# Altium integrated library 860010374011_Altium_WCAP-ATG8_rev19a.IntLib: 195 symbols (part 1 of 2) (continued)
## 860010372003
designator C?, comment 33uF, 16V
WCAP-ATG8 THT Aluminum Electrolytic Capacitors, D5mm x L11mm, 33uF, +/-20%, 16VDC; Part Number: 860010372003; Dissipation Factor: 16%; Endurance: 2000h; Leakage Current: 5.28uA; Ripple Current max.: 84mA; Technical Reference: ATBC110330M016DSPA3B000; ComponentLink1Description: Manufacturer; ComponentLink1URL: http://www.we-online.de; ComponentLink2Description: Datasheet; ComponentLink2URL: https://katalog.we-online.com/pbs/datasheet/860010372003.pdf; Length: 11mm; Mounting Technology: THT; Operating Temperature: -40 to +85degC; Packaging: Ammo Pack; Published Date: August 2019; Capacitance: 33uF; Diameter: 5mm; Publisher: Wurth Elektronik; Capacitance Tolerance: +/-20%; Rated Voltage: 16VDC
footprint WCAP-ATG8_5x11
pins: 1 N, 2 P

## 860010372004
designator C?, comment 47uF, 16V
WCAP-ATG8 THT Aluminum Electrolytic Capacitors, D5mm x L11mm, 47uF, +/-20%, 16VDC; Part Number: 860010372004; Dissipation Factor: 16%; Endurance: 2000h; Leakage Current: 7.52uA; Ripple Current max.: 132mA; Technical Reference: ATBC110470M016DSPA3B000; ComponentLink1Description: Manufacturer; ComponentLink1URL: http://www.we-online.de; ComponentLink2Description: Datasheet; ComponentLink2URL: https://katalog.we-online.com/pbs/datasheet/860010372004.pdf; Length: 11mm; Mounting Technology: THT; Operating Temperature: -40 to +85degC; Packaging: Ammo Pack; Published Date: August 2019; Capacitance: 47uF; Diameter: 5mm; Publisher: Wurth Elektronik; Capacitance Tolerance: +/-20%; Rated Voltage: 16VDC
footprint WCAP-ATG8_5x11
pins: 1 N, 2 P

## 860010372005
designator C?, comment 68uF, 16V
WCAP-ATG8 THT Aluminum Electrolytic Capacitors, D5mm x L11mm, 68uF, +/-20%, 16VDC; Part Number: 860010372005; Dissipation Factor: 16%; Endurance: 2000h; Leakage Current: 10.88uA; Ripple Current max.: 149mA; Technical Reference: ATBC110680M016DSPA3B000; ComponentLink1Description: Manufacturer; ComponentLink1URL: http://www.we-online.de; ComponentLink2Description: Datasheet; ComponentLink2URL: https://katalog.we-online.com/pbs/datasheet/860010372005.pdf; Length: 11mm; Mounting Technology: THT; Operating Temperature: -40 to +85degC; Packaging: Ammo Pack; Published Date: August 2019; Capacitance: 68uF; Diameter: 5mm; Publisher: Wurth Elektronik; Capacitance Tolerance: +/-20%; Rated Voltage: 16VDC
footprint WCAP-ATG8_5x11
pins: 1 N, 2 P

## 860010372006
designator C?, comment 100uF, 16V
WCAP-ATG8 THT Aluminum Electrolytic Capacitors, D5mm x L11mm, 100uF, +/-20%, 16VDC; Part Number: 860010372006; Dissipation Factor: 16%; Endurance: 2000h; Leakage Current: 16uA; Ripple Current max.: 176mA; Technical Reference: ATBC110101M016DSPA3B000; ComponentLink1Description: Manufacturer; ComponentLink1URL: http://www.we-online.de; ComponentLink2Description: Datasheet; ComponentLink2URL: https://katalog.we-online.com/pbs/datasheet/860010372006.pdf; Length: 11mm; Mounting Technology: THT; Operating Temperature: -40 to +85degC; Packaging: Ammo Pack; Published Date: August 2019; Capacitance: 100uF; Diameter: 5mm; Publisher: Wurth Elektronik; Capacitance Tolerance: +/-20%; Rated Voltage: 16VDC
footprint WCAP-ATG8_5x11
pins: 1 N, 2 P

## 860010373007
designator C?, comment 120uF, 16V
WCAP-ATG8 THT Aluminum Electrolytic Capacitors, D6.3mm x L11mm, 120uF, +/-20%, 16VDC; Part Number: 860010373007; Dissipation Factor: 16%; Endurance: 2000h; Leakage Current: 19.2uA; Ripple Current max.: 231mA; Technical Reference: ATBD110121M016DSPA4B000; ComponentLink1Description: Manufacturer; ComponentLink1URL: http://www.we-online.de; ComponentLink2Description: Datasheet; ComponentLink2URL: https://katalog.we-online.com/pbs/datasheet/860010373007.pdf; Length: 11mm; Mounting Technology: THT; Operating Temperature: -40 to +85degC; Packaging: Ammo Pack; Published Date: August 2019; Capacitance: 120uF; Diameter: 6.3mm; Publisher: Wurth Elektronik; Capacitance Tolerance: +/-20%; Rated Voltage: 16VDC
footprint WCAP-ATG8_6.3x11
pins: 1 N, 2 P

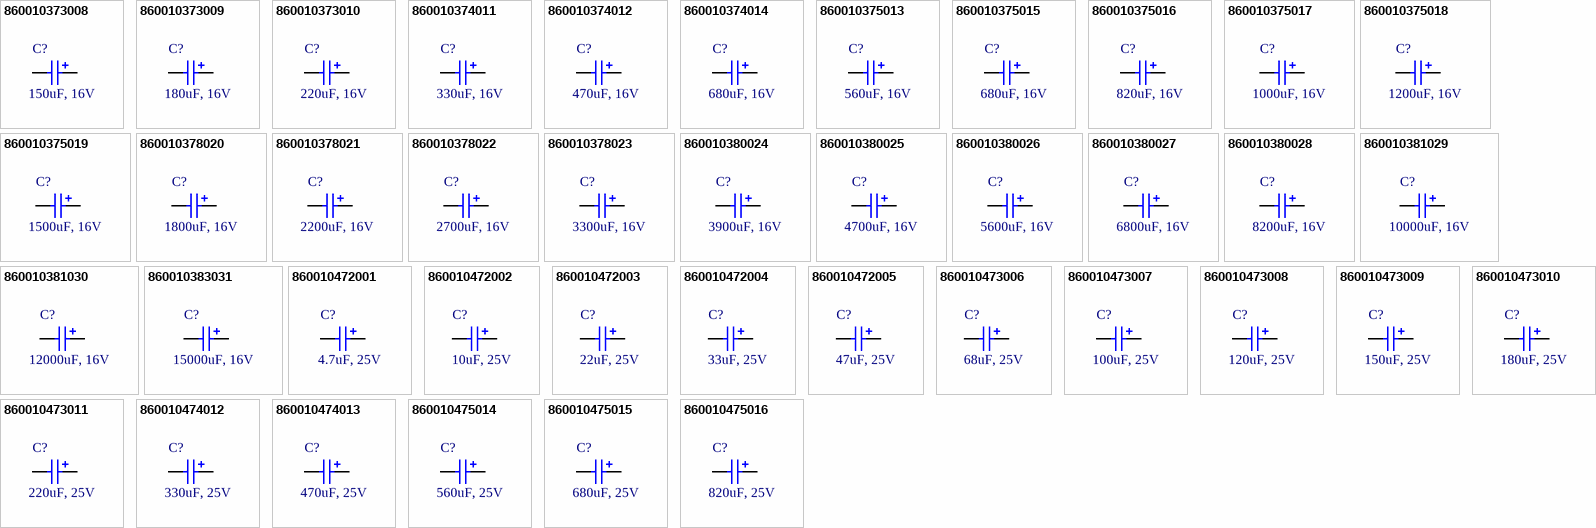
[diagram p1: symbols 860010373008 to 860010475016]

## 860010373008
designator C?, comment 150uF, 16V
WCAP-ATG8 THT Aluminum Electrolytic Capacitors, D6.3mm x L11mm, 150uF, +/-20%, 16VDC; Part Number: 860010373008; Dissipation Factor: 16%; Endurance: 2000h; Leakage Current: 24uA; Ripple Current max.: 253mA; Technical Reference: ATBD110151M016DSPA4B000; ComponentLink1Description: Manufacturer; ComponentLink1URL: http://www.we-online.de; ComponentLink2Description: Datasheet; ComponentLink2URL: https://katalog.we-online.com/pbs/datasheet/860010373008.pdf; Length: 11mm; Mounting Technology: THT; Operating Temperature: -40 to +85degC; Packaging: Ammo Pack; Published Date: August 2019; Capacitance: 150uF; Diameter: 6.3mm; Publisher: Wurth Elektronik; Capacitance Tolerance: +/-20%; Rated Voltage: 16VDC
footprint WCAP-ATG8_6.3x11
pins: 1 N, 2 P

## 860010373009
designator C?, comment 180uF, 16V
WCAP-ATG8 THT Aluminum Electrolytic Capacitors, D6.3mm x L11mm, 180uF, +/-20%, 16VDC; Part Number: 860010373009; Dissipation Factor: 16%; Endurance: 2000h; Leakage Current: 28.8uA; Ripple Current max.: 275mA; Technical Reference: ATBD110181M016DSPA4B000; ComponentLink1Description: Manufacturer; ComponentLink1URL: http://www.we-online.de; ComponentLink2Description: Datasheet; ComponentLink2URL: https://katalog.we-online.com/pbs/datasheet/860010373009.pdf; Length: 11mm; Mounting Technology: THT; Operating Temperature: -40 to +85degC; Packaging: Ammo Pack; Published Date: August 2019; Capacitance: 180uF; Diameter: 6.3mm; Publisher: Wurth Elektronik; Capacitance Tolerance: +/-20%; Rated Voltage: 16VDC
footprint WCAP-ATG8_6.3x11
pins: 1 N, 2 P

## 860010373010
designator C?, comment 220uF, 16V
WCAP-ATG8 THT Aluminum Electrolytic Capacitors, D6.3mm x L11mm, 220uF, +/-20%, 16VDC; Part Number: 860010373010; Dissipation Factor: 16%; Endurance: 2000h; Leakage Current: 35.2uA; Ripple Current max.: 308mA; Technical Reference: ATBD110221M016DSPA4B000; ComponentLink1Description: Manufacturer; ComponentLink1URL: http://www.we-online.de; ComponentLink2Description: Datasheet; ComponentLink2URL: https://katalog.we-online.com/pbs/datasheet/860010373010.pdf; Length: 11mm; Mounting Technology: THT; Operating Temperature: -40 to +85degC; Packaging: Ammo Pack; Published Date: August 2019; Capacitance: 220uF; Diameter: 6.3mm; Publisher: Wurth Elektronik; Capacitance Tolerance: +/-20%; Rated Voltage: 16VDC
footprint WCAP-ATG8_6.3x11
pins: 1 N, 2 P

## 860010374011
designator C?, comment 330uF, 16V
WCAP-ATG8 THT Aluminum Electrolytic Capacitors, D8mm x L11.5mm, 330uF, +/-20%, 16VDC; Part Number: 860010374011; Dissipation Factor: 16%; Endurance: 2000h; Leakage Current: 52.8uA; Ripple Current max.: 407mA; Technical Reference: ATBE115331M016DSPA7B000; ComponentLink1Description: Manufacturer; ComponentLink1URL: http://www.we-online.de; ComponentLink2Description: Datasheet; ComponentLink2URL: https://katalog.we-online.com/pbs/datasheet/860010374011.pdf; Length: 11.5mm; Mounting Technology: THT; Operating Temperature: -40 to +85degC; Packaging: Ammo Pack; Published Date: August 2019; Capacitance: 330uF; Diameter: 8mm; Publisher: Wurth Elektronik; Capacitance Tolerance: +/-20%; Rated Voltage: 16VDC
footprint WCAP-ATG8_8x11.5
pins: 1 N, 2 P

## 860010374012
designator C?, comment 470uF, 16V
WCAP-ATG8 THT Aluminum Electrolytic Capacitors, D8mm x L11.5mm, 470uF, +/-20%, 16VDC; Part Number: 860010374012; Dissipation Factor: 16%; Endurance: 2000h; Leakage Current: 75.2uA; Ripple Current max.: 517mA; Technical Reference: ATBE115471M016DSPA7B000; ComponentLink1Description: Manufacturer; ComponentLink1URL: http://www.we-online.de; ComponentLink2Description: Datasheet; ComponentLink2URL: https://katalog.we-online.com/pbs/datasheet/860010374012.pdf; Length: 11.5mm; Mounting Technology: THT; Operating Temperature: -40 to +85degC; Packaging: Ammo Pack; Published Date: August 2019; Capacitance: 470uF; Diameter: 8mm; Publisher: Wurth Elektronik; Capacitance Tolerance: +/-20%; Rated Voltage: 16VDC
footprint WCAP-ATG8_8x11.5
pins: 1 N, 2 P

## 860010374014
designator C?, comment 680uF, 16V
WCAP-ATG8 THT Aluminum Electrolytic Capacitors, D8mm x L16mm, 680uF, +/-20%, 16VDC; Part Number: 860010374014; Dissipation Factor: 16%; Endurance: 2000h; Leakage Current: 108.8uA; Ripple Current max.: 640mA; Technical Reference: ATBE160681M016DSPA7B000; ComponentLink1Description: Manufacturer; ComponentLink1URL: http://www.we-online.de; ComponentLink2Description: Datasheet; ComponentLink2URL: https://katalog.we-online.com/pbs/datasheet/860010374014.pdf; Length: 16mm; Mounting Technology: THT; Operating Temperature: -40 to +85degC; Packaging: Ammo Pack; Published Date: August 2019; Capacitance: 680uF; Diameter: 8mm; Publisher: Wurth Elektronik; Capacitance Tolerance: +/-20%; Rated Voltage: 16VDC
footprint WCAP-ATG8_8x16
pins: 1 N, 2 P

## 860010375013
designator C?, comment 560uF, 16V
WCAP-ATG8 THT Aluminum Electrolytic Capacitors, D10mm x L12.5mm, 560uF, +/-20%, 16VDC; Part Number: 860010375013; Dissipation Factor: 16%; Endurance: 2000h; Leakage Current: 89.6uA; Ripple Current max.: 572mA; Technical Reference: ATBF125561M016DSPA9B000; ComponentLink1Description: Manufacturer; ComponentLink1URL: http://www.we-online.de; ComponentLink2Description: Datasheet; ComponentLink2URL: https://katalog.we-online.com/pbs/datasheet/860010375013.pdf; Length: 12.5mm; Mounting Technology: THT; Operating Temperature: -40 to +85degC; Packaging: Ammo Pack; Published Date: August 2019; Capacitance: 560uF; Diameter: 10mm; Publisher: Wurth Elektronik; Capacitance Tolerance: +/-20%; Rated Voltage: 16VDC
footprint WCAP-ATG8_10x12.5
pins: 1 N, 2 P

## 860010375015
designator C?, comment 680uF, 16V
WCAP-ATG8 THT Aluminum Electrolytic Capacitors, D10mm x L12.5mm, 680uF, +/-20%, 16VDC; Part Number: 860010375015; Dissipation Factor: 16%; Endurance: 2000h; Leakage Current: 108.8uA; Ripple Current max.: 682mA; Technical Reference: ATBF125681M016DSPA9B000; ComponentLink1Description: Manufacturer; ComponentLink1URL: http://www.we-online.de; ComponentLink2Description: Datasheet; ComponentLink2URL: https://katalog.we-online.com/pbs/datasheet/860010375015.pdf; Length: 12.5mm; Mounting Technology: THT; Operating Temperature: -40 to +85degC; Packaging: Ammo Pack; Published Date: August 2019; Capacitance: 680uF; Diameter: 10mm; Publisher: Wurth Elektronik; Capacitance Tolerance: +/-20%; Rated Voltage: 16VDC
footprint WCAP-ATG8_10x12.5
pins: 1 N, 2 P

## 860010375016
designator C?, comment 820uF, 16V
WCAP-ATG8 THT Aluminum Electrolytic Capacitors, D10mm x L16mm, 820uF, +/-20%, 16VDC; Part Number: 860010375016; Dissipation Factor: 16%; Endurance: 2000h; Leakage Current: 131.2uA; Ripple Current max.: 803mA; Technical Reference: ATBF160821M016DSPAAB000; ComponentLink1Description: Manufacturer; ComponentLink1URL: http://www.we-online.de; ComponentLink2Description: Datasheet; ComponentLink2URL: https://katalog.we-online.com/pbs/datasheet/860010375016.pdf; Length: 16mm; Mounting Technology: THT; Operating Temperature: -40 to +85degC; Packaging: Ammo Pack; Published Date: August 2019; Capacitance: 820uF; Diameter: 10mm; Publisher: Wurth Elektronik; Capacitance Tolerance: +/-20%; Rated Voltage: 16VDC
footprint WCAP-ATG8_10x16
pins: 1 N, 2 P

## 860010375017
designator C?, comment 1000uF, 16V
WCAP-ATG8 THT Aluminum Electrolytic Capacitors, D10mm x L16mm, 1000uF, +/-20%, 16VDC; Part Number: 860010375017; Dissipation Factor: 16%; Endurance: 2000h; Leakage Current: 160uA; Ripple Current max.: 869mA; Technical Reference: ATBF160102M016DSPAAB000; ComponentLink1Description: Manufacturer; ComponentLink1URL: http://www.we-online.de; ComponentLink2Description: Datasheet; ComponentLink2URL: https://katalog.we-online.com/pbs/datasheet/860010375017.pdf; Length: 16mm; Mounting Technology: THT; Operating Temperature: -40 to +85degC; Packaging: Ammo Pack; Published Date: August 2019; Capacitance: 1000uF; Diameter: 10mm; Publisher: Wurth Elektronik; Capacitance Tolerance: +/-20%; Rated Voltage: 16VDC
footprint WCAP-ATG8_10x16
pins: 1 N, 2 P

## 860010375018
designator C?, comment 1200uF, 16V
WCAP-ATG8 THT Aluminum Electrolytic Capacitors, D10mm x L16mm, 1200uF, +/-20%, 16VDC; Part Number: 860010375018; Dissipation Factor: 16%; Endurance: 2000h; Leakage Current: 192uA; Ripple Current max.: 979mA; Technical Reference: ATBF160122M016DSPAAB000; ComponentLink1Description: Manufacturer; ComponentLink1URL: http://www.we-online.de; ComponentLink2Description: Datasheet; ComponentLink2URL: https://katalog.we-online.com/pbs/datasheet/860010375018.pdf; Length: 16mm; Mounting Technology: THT; Operating Temperature: -40 to +85degC; Packaging: Ammo Pack; Published Date: August 2019; Capacitance: 1200uF; Diameter: 10mm; Publisher: Wurth Elektronik; Capacitance Tolerance: +/-20%; Rated Voltage: 16VDC
footprint WCAP-ATG8_10x16
pins: 1 N, 2 P

## 860010375019
designator C?, comment 1500uF, 16V
WCAP-ATG8 THT Aluminum Electrolytic Capacitors, D10mm x L20mm, 1500uF, +/-20%, 16VDC; Part Number: 860010375019; Dissipation Factor: 16%; Endurance: 2000h; Leakage Current: 240uA; Ripple Current max.: 1100mA; Technical Reference: ATBF200152M016DSPAAB000; ComponentLink1Description: Manufacturer; ComponentLink1URL: http://www.we-online.de; ComponentLink2Description: Datasheet; ComponentLink2URL: https://katalog.we-online.com/pbs/datasheet/860010375019.pdf; Length: 20mm; Mounting Technology: THT; Operating Temperature: -40 to +85degC; Packaging: Ammo Pack; Published Date: August 2019; Capacitance: 1500uF; Diameter: 10mm; Publisher: Wurth Elektronik; Capacitance Tolerance: +/-20%; Rated Voltage: 16VDC
footprint WCAP-ATG8_10x20
pins: 1 N, 2 P

## 860010378020
designator C?, comment 1800uF, 16V
WCAP-ATG8 THT Aluminum Electrolytic Capacitors, D13mm x L20mm, 1800uF, +/-20%, 16VDC; Part Number: 860010378020; Dissipation Factor: 16%; Endurance: 2000h; Leakage Current: 288uA; Ripple Current max.: 1298mA; Technical Reference: ATBI200182M016DSPACB000; ComponentLink1Description: Manufacturer; ComponentLink1URL: http://www.we-online.de; ComponentLink2Description: Datasheet; ComponentLink2URL: https://katalog.we-online.com/pbs/datasheet/860010378020.pdf; Length: 20mm; Mounting Technology: THT; Operating Temperature: -40 to +85degC; Packaging: Ammo Pack; Published Date: August 2019; Capacitance: 1800uF; Diameter: 13mm; Publisher: Wurth Elektronik; Capacitance Tolerance: +/-20%; Rated Voltage: 16VDC
footprint WCAP-ATG8_13x20
pins: 1 N, 2 P

## 860010378021
designator C?, comment 2200uF, 16V
WCAP-ATG8 THT Aluminum Electrolytic Capacitors, D13mm x L20mm, 2200uF, +/-20%, 16VDC; Part Number: 860010378021; Dissipation Factor: 18%; Endurance: 2000h; Leakage Current: 352uA; Ripple Current max.: 1485mA; Technical Reference: ATBI200222M016DSPACB000; ComponentLink1Description: Manufacturer; ComponentLink1URL: http://www.we-online.de; ComponentLink2Description: Datasheet; ComponentLink2URL: https://katalog.we-online.com/pbs/datasheet/860010378021.pdf; Length: 20mm; Mounting Technology: THT; Operating Temperature: -40 to +85degC; Packaging: Ammo Pack; Published Date: August 2019; Capacitance: 2200uF; Diameter: 13mm; Publisher: Wurth Elektronik; Capacitance Tolerance: +/-20%; Rated Voltage: 16VDC
footprint WCAP-ATG8_13x20
pins: 1 N, 2 P

## 860010378022
designator C?, comment 2700uF, 16V
WCAP-ATG8 THT Aluminum Electrolytic Capacitors, D13mm x L20mm, 2700uF, +/-20%, 16VDC; Part Number: 860010378022; Dissipation Factor: 18%; Endurance: 2000h; Leakage Current: 432uA; Ripple Current max.: 1716mA; Technical Reference: ATBI200272M016DSPACB000; ComponentLink1Description: Manufacturer; ComponentLink1URL: http://www.we-online.de; ComponentLink2Description: Datasheet; ComponentLink2URL: https://katalog.we-online.com/pbs/datasheet/860010378022.pdf; Length: 20mm; Mounting Technology: THT; Operating Temperature: -40 to +85degC; Packaging: Ammo Pack; Published Date: August 2019; Capacitance: 2700uF; Diameter: 13mm; Publisher: Wurth Elektronik; Capacitance Tolerance: +/-20%; Rated Voltage: 16VDC
footprint WCAP-ATG8_13x20
pins: 1 N, 2 P

## 860010378023
designator C?, comment 3300uF, 16V
WCAP-ATG8 THT Aluminum Electrolytic Capacitors, D13mm x L20mm, 3300uF, +/-20%, 16VDC; Part Number: 860010378023; Dissipation Factor: 20%; Endurance: 2000h; Leakage Current: 528uA; Ripple Current max.: 1750mA; Technical Reference: ATBI200332M016DSPACB000; ComponentLink1Description: Manufacturer; ComponentLink1URL: http://www.we-online.de; ComponentLink2Description: Datasheet; ComponentLink2URL: https://katalog.we-online.com/pbs/datasheet/860010378023.pdf; Length: 20mm; Mounting Technology: THT; Operating Temperature: -40 to +85degC; Packaging: Ammo Pack; Published Date: August 2019; Capacitance: 3300uF; Diameter: 13mm; Publisher: Wurth Elektronik; Capacitance Tolerance: +/-20%; Rated Voltage: 16VDC
footprint WCAP-ATG8_13x20
pins: 1 N, 2 P

## 860010380024
designator C?, comment 3900uF, 16V
WCAP-ATG8 THT Aluminum Electrolytic Capacitors, D16mm x L25mm, 3900uF, +/-20%, 16VDC; Part Number: 860010380024; Dissipation Factor: 20%; Endurance: 2000h; Leakage Current: 624uA; Ripple Current max.: 2002mA; Technical Reference: ATBK250392M016DSPAEB000; ComponentLink1Description: Manufacturer; ComponentLink1URL: http://www.we-online.de; ComponentLink2Description: Datasheet; ComponentLink2URL: https://katalog.we-online.com/pbs/datasheet/860010380024.pdf; Length: 25mm; Mounting Technology: THT; Operating Temperature: -40 to +85degC; Packaging: Ammo Pack; Published Date: August 2019; Capacitance: 3900uF; Diameter: 16mm; Publisher: Wurth Elektronik; Capacitance Tolerance: +/-20%; Rated Voltage: 16VDC
footprint WCAP-ATG8_16x25
pins: 1 N, 2 P

## 860010380025
designator C?, comment 4700uF, 16V
WCAP-ATG8 THT Aluminum Electrolytic Capacitors, D16mm x L25mm, 4700uF, +/-20%, 16VDC; Part Number: 860010380025; Dissipation Factor: 22%; Endurance: 2000h; Leakage Current: 752uA; Ripple Current max.: 2310mA; Technical Reference: ATBK250472M016DSPAEB000; ComponentLink1Description: Manufacturer; ComponentLink1URL: http://www.we-online.de; ComponentLink2Description: Datasheet; ComponentLink2URL: https://katalog.we-online.com/pbs/datasheet/860010380025.pdf; Length: 25mm; Mounting Technology: THT; Operating Temperature: -40 to +85degC; Packaging: Ammo Pack; Published Date: August 2019; Capacitance: 4700uF; Diameter: 16mm; Publisher: Wurth Elektronik; Capacitance Tolerance: +/-20%; Rated Voltage: 16VDC
footprint WCAP-ATG8_16x25
pins: 1 N, 2 P

## 860010380026
designator C?, comment 5600uF, 16V
WCAP-ATG8 THT Aluminum Electrolytic Capacitors, D16mm x L31.5mm, 5600uF, +/-20%, 16VDC; Part Number: 860010380026; Dissipation Factor: 24%; Endurance: 2000h; Leakage Current: 896uA; Ripple Current max.: 2453mA; Technical Reference: ATBK315562M016DSPADB000; ComponentLink1Description: Manufacturer; ComponentLink1URL: http://www.we-online.de; ComponentLink2Description: Datasheet; ComponentLink2URL: https://katalog.we-online.com/pbs/datasheet/860010380026.pdf; Length: 31.5mm; Mounting Technology: THT; Operating Temperature: -40 to +85degC; Packaging: Ammo Pack; Published Date: August 2019; Capacitance: 5600uF; Diameter: 16mm; Publisher: Wurth Elektronik; Capacitance Tolerance: +/-20%; Rated Voltage: 16VDC
footprint WCAP-ATG8_16x31.5
pins: 1 N, 2 P

## 860010380027
designator C?, comment 6800uF, 16V
WCAP-ATG8 THT Aluminum Electrolytic Capacitors, D16mm x L31.5mm, 6800uF, +/-20%, 16VDC; Part Number: 860010380027; Dissipation Factor: 26%; Endurance: 2000h; Leakage Current: 1088uA; Ripple Current max.: 2805mA; Technical Reference: ATBK315682M016DSPADB000; ComponentLink1Description: Manufacturer; ComponentLink1URL: http://www.we-online.de; ComponentLink2Description: Datasheet; ComponentLink2URL: https://katalog.we-online.com/pbs/datasheet/860010380027.pdf; Length: 31.5mm; Mounting Technology: THT; Operating Temperature: -40 to +85degC; Packaging: Ammo Pack; Published Date: August 2019; Capacitance: 6800uF; Diameter: 16mm; Publisher: Wurth Elektronik; Capacitance Tolerance: +/-20%; Rated Voltage: 16VDC
footprint WCAP-ATG8_16x31.5
pins: 1 N, 2 P

## 860010380028
designator C?, comment 8200uF, 16V
WCAP-ATG8 THT Aluminum Electrolytic Capacitors, D16mm x L35.5mm, 8200uF, +/-20%, 16VDC; Part Number: 860010380028; Dissipation Factor: 30%; Endurance: 2000h; Leakage Current: 1312uA; Ripple Current max.: 2893mA; Technical Reference: ATBK355822M016DSPADB000; ComponentLink1Description: Manufacturer; ComponentLink1URL: http://www.we-online.de; ComponentLink2Description: Datasheet; ComponentLink2URL: https://katalog.we-online.com/pbs/datasheet/860010380028.pdf; Length: 35.5mm; Mounting Technology: THT; Operating Temperature: -40 to +85degC; Packaging: Ammo Pack; Published Date: August 2019; Capacitance: 8200uF; Diameter: 16mm; Publisher: Wurth Elektronik; Capacitance Tolerance: +/-20%; Rated Voltage: 16VDC
footprint WCAP-ATG8_16x35.5
pins: 1 N, 2 P

## 860010381029
designator C?, comment 10000uF, 16V
WCAP-ATG8 THT Aluminum Electrolytic Capacitors, D18mm x L35.5mm, 10000uF, +/-20%, 16VDC; Part Number: 860010381029; Dissipation Factor: 34%; Endurance: 2000h; Leakage Current: 1600uA; Ripple Current max.: 2970mA; Technical Reference: ATBL355103M016DSPAEB000; ComponentLink1Description: Manufacturer; ComponentLink1URL: http://www.we-online.de; ComponentLink2Description: Datasheet; ComponentLink2URL: https://katalog.we-online.com/pbs/datasheet/860010381029.pdf; Length: 35.5mm; Mounting Technology: THT; Operating Temperature: -40 to +85degC; Packaging: Ammo Pack; Published Date: August 2019; Capacitance: 10000uF; Diameter: 18mm; Publisher: Wurth Elektronik; Capacitance Tolerance: +/-20%; Rated Voltage: 16VDC
footprint WCAP-ATG8_18x35.5
pins: 1 N, 2 P

## 860010381030
designator C?, comment 12000uF, 16V
WCAP-ATG8 THT Aluminum Electrolytic Capacitors, D18mm x L35.5mm, 12000uF, +/-20%, 16VDC; Part Number: 860010381030; Dissipation Factor: 38%; Endurance: 2000h; Leakage Current: 1920uA; Ripple Current max.: 3058mA; Technical Reference: ATBL355123M016DSPAEB000; ComponentLink1Description: Manufacturer; ComponentLink1URL: http://www.we-online.de; ComponentLink2Description: Datasheet; ComponentLink2URL: https://katalog.we-online.com/pbs/datasheet/860010381030.pdf; Length: 35.5mm; Mounting Technology: THT; Operating Temperature: -40 to +85degC; Packaging: Ammo Pack; Published Date: August 2019; Capacitance: 12000uF; Diameter: 18mm; Publisher: Wurth Elektronik; Capacitance Tolerance: +/-20%; Rated Voltage: 16VDC
footprint WCAP-ATG8_18x35.5
pins: 1 N, 2 P

## 860010383031
designator C?, comment 15000uF, 16V
WCAP-ATG8 THT Aluminum Electrolytic Capacitors, D22mm x L41mm, 15000uF, +/-20%, 16VDC; Part Number: 860010383031; Dissipation Factor: 44%; Endurance: 2000h; Leakage Current: 2400uA; Ripple Current max.: 3905mA; Technical Reference: ATBN410153M016DSPS2B000; ComponentLink1Description: Manufacturer; ComponentLink1URL: http://www.we-online.de; ComponentLink2Description: Datasheet; ComponentLink2URL: https://katalog.we-online.com/pbs/datasheet/860010383031.pdf; Length: 41mm; Mounting Technology: THT; Operating Temperature: -40 to +85degC; Packaging: Ammo Pack; Published Date: August 2019; Capacitance: 15000uF; Diameter: 22mm; Publisher: Wurth Elektronik; Capacitance Tolerance: +/-20%; Rated Voltage: 16VDC
footprint WCAP-ATG8_22x41
pins: 1 N, 2 P

## 860010472001
designator C?, comment 4.7uF, 25V
WCAP-ATG8 THT Aluminum Electrolytic Capacitors, D5mm x L11mm, 4.7uF, +/-20%, 25VDC; Part Number: 860010472001; Dissipation Factor: 14%; Endurance: 2000h; Leakage Current: 3uA; Ripple Current max.: 34mA; Technical Reference: ATBC1104R7M025DSPA3B000; ComponentLink1Description: Manufacturer; ComponentLink1URL: http://www.we-online.de; ComponentLink2Description: Datasheet; ComponentLink2URL: https://katalog.we-online.com/pbs/datasheet/860010472001.pdf; Length: 11mm; Mounting Technology: THT; Operating Temperature: -40 to +85degC; Packaging: Ammo Pack; Published Date: August 2019; Capacitance: 4.7uF; Diameter: 5mm; Publisher: Wurth Elektronik; Capacitance Tolerance: +/-20%; Rated Voltage: 25VDC
footprint WCAP-ATG8_5x11
pins: 1 N, 2 P

## 860010472002
designator C?, comment 10uF, 25V
WCAP-ATG8 THT Aluminum Electrolytic Capacitors, D5mm x L11mm, 10uF, +/-20%, 25VDC; Part Number: 860010472002; Dissipation Factor: 14%; Endurance: 2000h; Leakage Current: 3uA; Ripple Current max.: 50mA; Technical Reference: ATBC110100M025DSPA3B000; ComponentLink1Description: Manufacturer; ComponentLink1URL: http://www.we-online.de; ComponentLink2Description: Datasheet; ComponentLink2URL: https://katalog.we-online.com/pbs/datasheet/860010472002.pdf; Length: 11mm; Mounting Technology: THT; Operating Temperature: -40 to +85degC; Packaging: Ammo Pack; Published Date: August 2019; Capacitance: 10uF; Diameter: 5mm; Publisher: Wurth Elektronik; Capacitance Tolerance: +/-20%; Rated Voltage: 25VDC
footprint WCAP-ATG8_5x11
pins: 1 N, 2 P

## 860010472003
designator C?, comment 22uF, 25V
WCAP-ATG8 THT Aluminum Electrolytic Capacitors, D5mm x L11mm, 22uF, +/-20%, 25VDC; Part Number: 860010472003; Dissipation Factor: 14%; Endurance: 2000h; Leakage Current: 5.5uA; Ripple Current max.: 94mA; Technical Reference: ATBC110220M025DSPA3B000; ComponentLink1Description: Manufacturer; ComponentLink1URL: http://www.we-online.de; ComponentLink2Description: Datasheet; ComponentLink2URL: https://katalog.we-online.com/pbs/datasheet/860010472003.pdf; Length: 11mm; Mounting Technology: THT; Operating Temperature: -40 to +85degC; Packaging: Ammo Pack; Published Date: August 2019; Capacitance: 22uF; Diameter: 5mm; Publisher: Wurth Elektronik; Capacitance Tolerance: +/-20%; Rated Voltage: 25VDC
footprint WCAP-ATG8_5x11
pins: 1 N, 2 P

## 860010472004
designator C?, comment 33uF, 25V
WCAP-ATG8 THT Aluminum Electrolytic Capacitors, D5mm x L11mm, 33uF, +/-20%, 25VDC; Part Number: 860010472004; Dissipation Factor: 14%; Endurance: 2000h; Leakage Current: 8.25uA; Ripple Current max.: 105mA; Technical Reference: ATBC110330M025DSPA3B000; ComponentLink1Description: Manufacturer; ComponentLink1URL: http://www.we-online.de; ComponentLink2Description: Datasheet; ComponentLink2URL: https://katalog.we-online.com/pbs/datasheet/860010472004.pdf; Length: 11mm; Mounting Technology: THT; Operating Temperature: -40 to +85degC; Packaging: Ammo Pack; Published Date: August 2019; Capacitance: 33uF; Diameter: 5mm; Publisher: Wurth Elektronik; Capacitance Tolerance: +/-20%; Rated Voltage: 25VDC
footprint WCAP-ATG8_5x11
pins: 1 N, 2 P

## 860010472005
designator C?, comment 47uF, 25V
WCAP-ATG8 THT Aluminum Electrolytic Capacitors, D5mm x L11mm, 47uF, +/-20%, 25VDC; Part Number: 860010472005; Dissipation Factor: 14%; Endurance: 2000h; Leakage Current: 11.75uA; Ripple Current max.: 132mA; Technical Reference: ATBC110470M025DSPA3B000; ComponentLink1Description: Manufacturer; ComponentLink1URL: http://www.we-online.de; ComponentLink2Description: Datasheet; ComponentLink2URL: https://katalog.we-online.com/pbs/datasheet/860010472005.pdf; Length: 11mm; Mounting Technology: THT; Operating Temperature: -40 to +85degC; Packaging: Ammo Pack; Published Date: August 2019; Capacitance: 47uF; Diameter: 5mm; Publisher: Wurth Elektronik; Capacitance Tolerance: +/-20%; Rated Voltage: 25VDC
footprint WCAP-ATG8_5x11
pins: 1 N, 2 P

## 860010473006
designator C?, comment 68uF, 25V
WCAP-ATG8 THT Aluminum Electrolytic Capacitors, D6.3mm x L11mm, 68uF, +/-20%, 25VDC; Part Number: 860010473006; Dissipation Factor: 14%; Endurance: 2000h; Leakage Current: 17uA; Ripple Current max.: 176mA; Technical Reference: ATBD110680M025DSPA4B000; ComponentLink1Description: Manufacturer; ComponentLink1URL: http://www.we-online.de; ComponentLink2Description: Datasheet; ComponentLink2URL: https://katalog.we-online.com/pbs/datasheet/860010473006.pdf; Length: 11mm; Mounting Technology: THT; Operating Temperature: -40 to +85degC; Packaging: Ammo Pack; Published Date: August 2019; Capacitance: 68uF; Diameter: 6.3mm; Publisher: Wurth Elektronik; Capacitance Tolerance: +/-20%; Rated Voltage: 25VDC
footprint WCAP-ATG8_6.3x11
pins: 1 N, 2 P

## 860010473007
designator C?, comment 100uF, 25V
WCAP-ATG8 THT Aluminum Electrolytic Capacitors, D6.3mm x L11mm, 100uF, +/-20%, 25VDC; Part Number: 860010473007; Dissipation Factor: 14%; Endurance: 2000h; Leakage Current: 25uA; Ripple Current max.: 209mA; Technical Reference: ATBD110101M025DSPA4B000; ComponentLink1Description: Manufacturer; ComponentLink1URL: http://www.we-online.de; ComponentLink2Description: Datasheet; ComponentLink2URL: https://katalog.we-online.com/pbs/datasheet/860010473007.pdf; Length: 11mm; Mounting Technology: THT; Operating Temperature: -40 to +85degC; Packaging: Ammo Pack; Published Date: August 2019; Capacitance: 100uF; Diameter: 6.3mm; Publisher: Wurth Elektronik; Capacitance Tolerance: +/-20%; Rated Voltage: 25VDC
footprint WCAP-ATG8_6.3x11
pins: 1 N, 2 P
